# Altium footprint library altium_parts_templates_PCB.PcbLib: 93 footprints (part 5 of 6)
Each footprint in its own frame and in the unit in brackets; x right, y up, seen from the top. Pads: shape width x height; smd on the part's side, far side on the other; paste and mask are expansions set on the pad; w line width, h text height; cw(c..) or ccw(c..) is an arc to the next point about the centre after c.
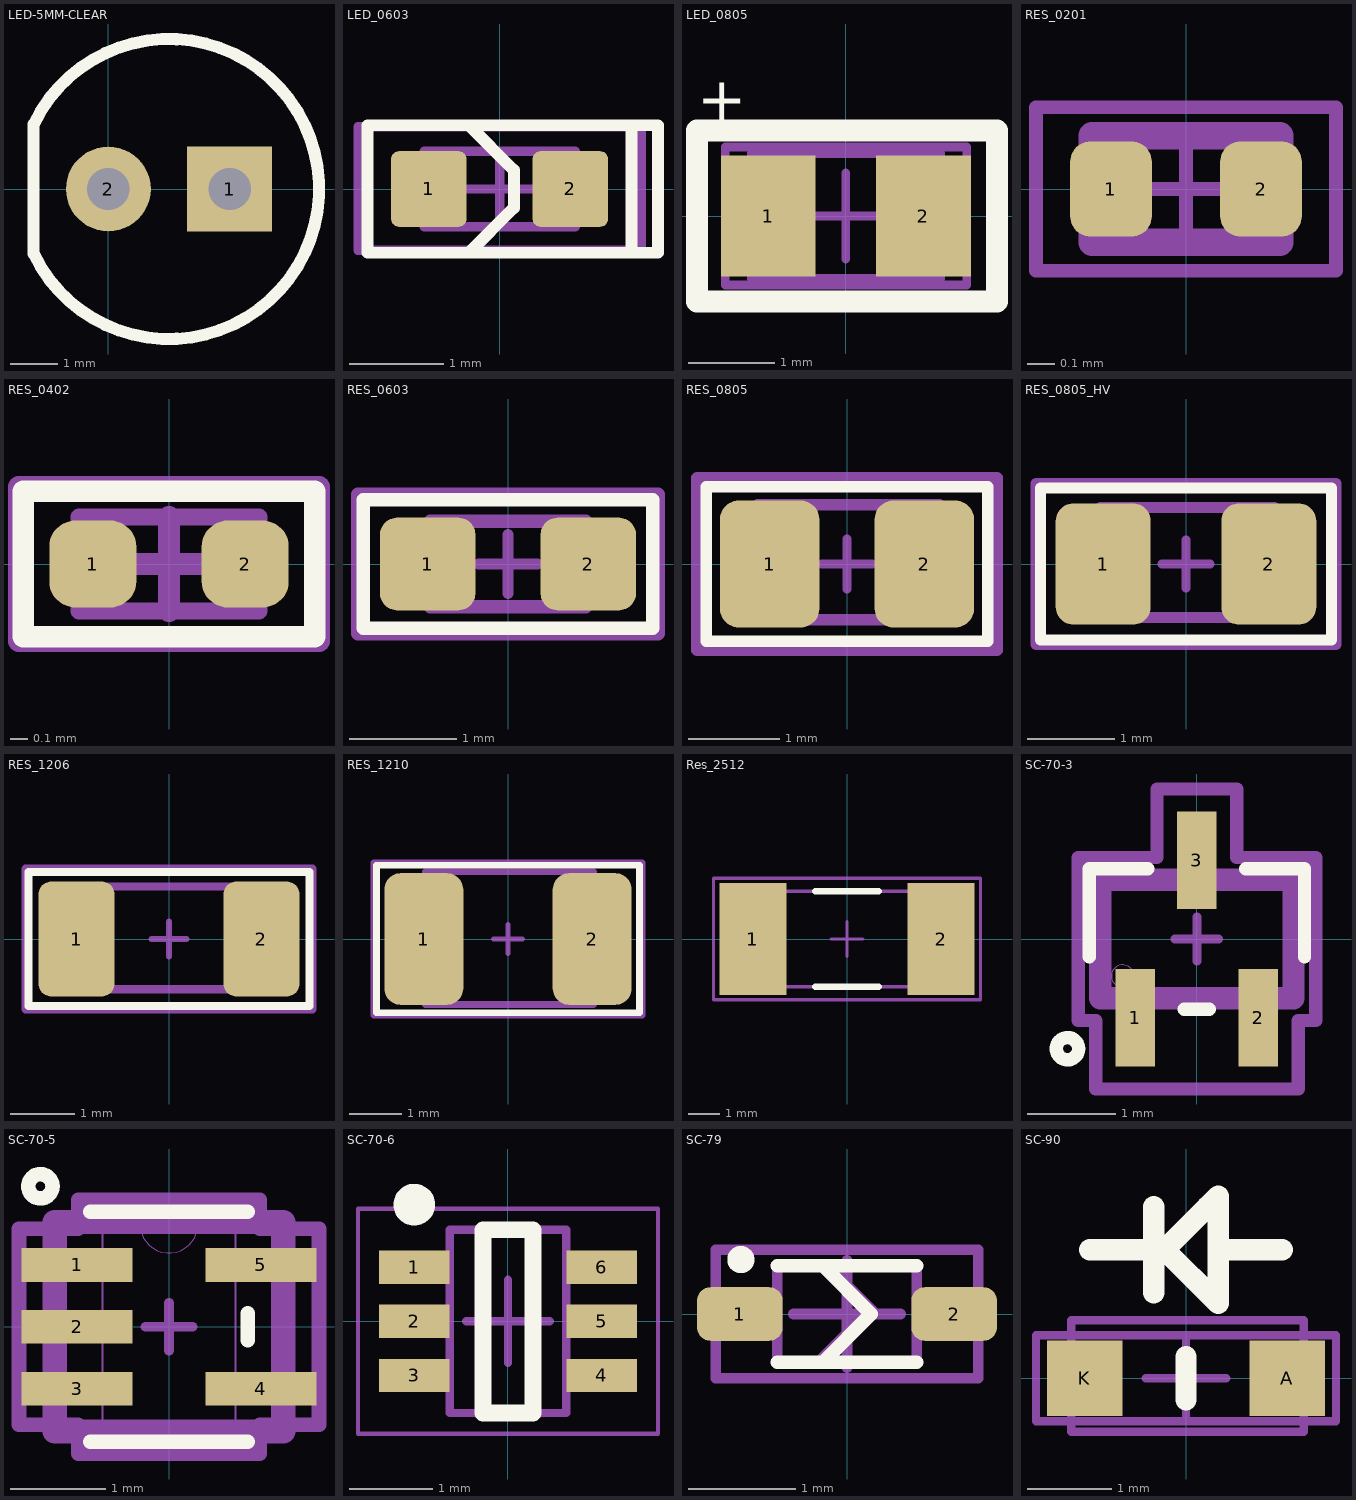
[diagram p4: the footprints below, top view; thin cyan lines are the x and y axes]

## LED-5MM-CLEAR [mil] "LED 5MM - Through Hole"
height 200
pads (2):
  rect 70x70 hole 35: 1(100,0)
  round 70 hole 35: 2(0,0)
Top Overlay:
  lines w10: -61.59,-53.37 ccw(c50,0) -61.59,53.37 -61.59,-53.37
3D body "SW3dPS-LEDd5C.STEP": height 344.75, standoff -237.93, extent -45.69,-119 167.69,117.99

## LED_0603 [mm] "LED_0603"
height 1.45
pads (2):
  rrect20% 0.8x0.8 smd paste-0.025 mask+0.05: 1(-0.749,0) 2(0.749,0)
Top Overlay:
  lines w0.127: -0.325,-0.675 0.15,-0.2 0.15,0.2 -0.325,0.675 ; 1.397,-0.675 1.397,0.675 1.676,0.675 1.676,-0.675 -1.4,-0.675 -1.4,0.675 1.626,0.675
Top Assembly Drawing:
  lines w0.1: -0.8,-0.4 -0.8,0.4 0.8,0.4 0.8,-0.4 -0.8,-0.4
Top Courtyard:
  lines w0.1: -0.4,0 0.4,0 ; 0,-0.4 0,0.4 ; -1.5,-0.65 -1.5,0.66 1.5,0.66 1.5,-0.65 -1.5,-0.65
3D body "LED-0603H0.75.stp": height 0.75, standoff 0, extent -0.85,-0.45 0.85,0.45

## LED_0805 [mm] "LED_0805"
height 1.4
pads (2):
  rect 1.1x1.4 smd: 1(-0.9,0) 2(0.9,0)
Top Overlay:
  lines w0.254: -1.727,-0.991 1.753,-0.991 1.753,0.864 1.753,0.991 -1.727,0.991 -1.727,-0.991
  text "+" at -1.727,1.118 h0.5
Top 3D Model:
  lines w0.1: -1.1,-0.725 -1.1,0.725 1.1,0.725 1.1,-0.725 -1.1,-0.725
Top Courtyard:
  lines w0.1: -0.5,0 0.5,0 ; 0,-0.5 0,0.5 ; -1.4,-0.8 -1.4,0.8 1.4,0.8 1.4,-0.8 -1.4,-0.8
3D body: height 0.2, standoff 0, extent -1.1,-0.725 1.1,0.725
3D body: height 1.5, standoff 0.2, extent -0.6,-0.725 0.6,0.725

## RES_0201 [mm] "Resistor 0201"
height 0.25
pads (2):
  rrect50% 0.3x0.35 smd paste+0 mask+0.02: 1(-0.275,0) 2(0.275,0)
Top Assembly Drawing:
  lines w0.1: -0.345,-0.195 0.345,-0.195 0.345,0.195 -0.345,0.195 -0.345,-0.195
Top Courtyard:
  lines w0.05: -0.195,0 0.195,0 ; 0,-0.195 0,0.195 ; -0.55,-0.3 -0.55,0.3 0.55,0.3 0.55,-0.3 -0.55,-0.3
3D body "RES0201.stp": height 0.28, standoff -0.02, extent -0.3,-0.15 0.3,0.15

## RES_0402 [mil] "Resistor - 0402"
height 13.78
pads (2):
  rrect60% 20x20 smd paste+0 mask+1.97: 1(-17.5,0) 2(17.5,0)
Top Overlay:
  lines w5: -33.46,-16.73 -33.46,16.73 33.46,16.73 33.46,-16.73 -33.46,-16.73
Top Assembly Drawing:
  lines w3.94: -20.67,-10.83 -20.67,10.83 20.67,10.83 20.67,-10.83 -20.67,-10.83
Top Courtyard:
  lines w5: -10.83,0 10.83,0 ; 0,-10.83 0,10.83 ; -34.45,-17.72 34.45,-17.72 34.45,17.72 -34.45,17.72 -34.45,-17.72
3D body "RES0402.stp": height 11.02, standoff -0.79, extent -19.68,-9.84 19.7,9.85

## RES_0603 [mil] "Resistor - 0603"
height 17.72
pads (2):
  rrect35% 35x34 smd paste+0 mask+1.97: 1(-29.5,0) 2(29.5,0)
Top Overlay:
  lines w5: -53.15,-23.62 53.15,-23.62 53.15,23.62 -53.15,23.62 -53.15,-23.62
Top Assembly Drawing:
  lines w5: -28.54,-15.75 28.54,-15.75 28.54,15.75 -28.54,15.75 -28.54,-15.75
Top Courtyard:
  lines w3.94: -10.83,0 10.83,0 ; 0,-10.83 0,10.83
  lines w5: -55.12,-25.59 55.12,-25.59 55.12,25.59 -55.12,25.59 -55.12,-25.59
3D body "RES0603.stp": height 16.93, standoff -0.79, extent -31.49,-15.74 31.51,15.76

## RES_0805 [mil] "Resistor - 0805"
height 19.68
pads (2):
  rrect37% 43x55 smd paste+0 mask+1.97: 1(-33.5,0) 2(33.5,0)
Top Overlay:
  lines w5: -61.02,-33.46 61.02,-33.46 61.02,33.46 -61.02,33.46 -61.02,-33.46
Top Assembly Drawing:
  lines w5: -38.74,-24.21 -38.74,25.59 40,25.59 40,-24.21 -38.74,-24.21
Top Courtyard:
  lines w3.94: -10.83,0 10.83,0 ; 0,-10.83 0,10.83
  lines w5: -64.96,-37.4 64.96,-37.4 64.96,37.4 -64.96,37.4 -64.96,-37.4
3D body "RES0805.stp": height 18.9, standoff -0.79, extent -39.36,-24.8 39.38,24.42

## RES_0805_HV [mil] "Resistor - 0805 - HV"
height 19.68
pads (2):
  rrect37% 43x55 smd paste+0 mask+1.97: 1(-37.5,0) 2(37.5,0)
Top Overlay:
  lines w5: -65.94,-34.45 65.94,-34.45 65.94,34.45 -65.94,34.45 -65.94,-34.45
Top Assembly Drawing:
  lines w5: -38.74,-24.21 -38.74,25.59 40,25.59 40,-24.21 -38.74,-24.21
Top Courtyard:
  lines w3.94: -10.83,0 10.83,0 ; 0,-10.83 0,10.83
  lines w5: -67.91,-36.42 67.91,-36.42 67.91,36.42 -67.91,36.42 -67.91,-36.42
3D body "RES0805.stp": height 18.9, standoff -0.79, extent -39.36,-24.8 39.38,24.42

## RES_1206 [mil] "Resistor - 1206"
height 21.65
pads (2):
  rrect34% 47x71 smd paste+0 mask+1.97: 1(-57,0) 2(57,0)
Top Overlay:
  lines w5: -86.61,-41.34 -86.61,41.34 86.61,41.34 86.61,-41.34 -86.61,-41.34
Top Assembly Drawing:
  lines w5: -62.99,-30.99 63.98,-30.99 63.98,32.48 -62.99,32.48 -62.99,-30.99
Top Courtyard:
  lines w3.94: -10.83,0 10.83,0 ; 0,-10.83 0,10.83
  lines w5: -88.58,-43.31 -88.58,43.31 88.58,43.31 88.58,-43.31 -88.58,-43.31
3D body "RES1206.stp": height 20.87, standoff -0.79, extent -61.02,-30.39 61.03,30.71

## RES_1210 [mm] "Resistor - 1210"
height 0.55
pads (2):
  rrect40% 1.5x2.5 smd paste+0 mask+0.05: 1(-1.6,0) 2(1.6,0)
Top Overlay:
  lines w0.127: -2.5,-1.4 -2.5,1.4 2.5,1.4 2.5,-1.4 -2.5,-1.4
Top Assembly Drawing:
  lines w0.127: -1.575,-1.245 1.625,-1.245 1.625,1.275 -1.575,1.275 -1.575,-1.245
Top Courtyard:
  lines w0.1: -0.275,0 0.275,0 ; 0,-0.275 0,0.275
  lines w0.127: -2.55,-1.45 2.55,-1.45 2.55,1.45 -2.55,1.45 -2.55,-1.45
3D body "User Library-RESC3225X06N.STEP": height 0.53, standoff -0.02, extent -1.625,-1.25 1.575,1.25

## Res_2512 [mil]
pads (2):
  rect 82.5x138 smd paste-11.81: 1(-116.25,0) 2(116.25,0)
Top Overlay:
  lines w7.87: -39.37,-59.06 39.37,-59.06 ; -39.37,59.06 39.37,59.06
Top 3D Model:
  lines w3.94: -125,-59 -125,59 126,59 126,-59 -125,-59
Top Courtyard:
  lines w3.94: -19.69,0 19.68,0 ; 0,-21.65 0,21.65 ; -165,-75 -165,75 165,75 165,-75 -165,-75
3D body "R_2512.step": height 63.07, standoff 0, extent -124.99,-59.05 125,59.06

## SC-70-3 [mm] "SOT-323, SC-70-3"
pads (3):
  rect 0.451x1.111 smd paste+0 mask+0: 1(-0.7,-0.9) 2(0.7,-0.9) 3(0,0.9)
Top Overlay:
  circle w0.152: c-1.475,-1.25 r0.127
  lines w0.152: -1.227,-0.204 -1.227,0.802 -0.558,0.802 ; -0.142,-0.802 0.142,-0.802 ; 0.558,0.802 1.227,0.802 1.227,-0.204
Top Assembly Drawing:
  lines w0.254: -1.1,-0.675 1.1,-0.675 1.1,0.675 -1.1,0.675 -1.1,-0.675
Top 3D Model:
  circle w0: c-0.846,-0.421 r0.127
  lines w0.025: -1.1,-0.675 -1.1,0.675 1.1,0.675 1.1,-0.675 -1.1,-0.675 ; -0.9,-1.1 -0.5,-1.1 -0.5,-0.675 -0.9,-0.675 -0.9,-1.1 ; -0.2,0.675 -0.2,1.1 0.2,1.1 0.2,0.675 -0.2,0.675 ; 0.5,-1.1 0.9,-1.1 0.9,-0.675 0.5,-0.675 0.5,-1.1
Top Courtyard:
  lines w0.1: -0.25,0 0.25,0 ; 0,-0.25 0,0.25
  lines w0.152: -1.354,-0.929 -1.154,-0.929 -1.154,-1.71 1.154,-1.71 1.154,-0.929 1.354,-0.929 1.354,0.929 0.454,0.929 0.454,1.71 -0.454,1.71 -0.454,0.929 -1.354,0.929 -1.354,-0.929

## SC-70-5 [mil] "SOT-353, 5-TSSOP, SC-70-5"
pads (5):
  rect 46x14 smd paste+0 mask+0: 1(-38,25.59) 2(-38,0) 3(-38,-25.59) 4(38,-25.59) 5(38,25.59)
Top Overlay:
  circle w6: c-53.15,58.07 r5
  lines w6: -32.5,-47.5 32.5,-47.5 ; -32.5,47.5 32.5,47.5 ; 32.5,-5.49 32.5,5.49
Top Assembly Drawing:
  lines w10: -47.24,-43.31 47.24,-43.31 47.24,43.31 -47.24,43.31 -47.24,-43.31
Top 3D Model:
  lines w0: -12,42.5 ccw(c0,42.5) 12,42.5
  lines w1: -47,-31.59 -47,-19.59 -27.5,-19.59 -27.5,-31.59 -47,-31.59 ; -47,-6 -47,6 -27.5,6 -27.5,-6 -47,-6 ; -47,19.59 -47,31.59 -27.5,31.59 -27.5,19.59 -47,19.59 ; -27.5,-42.5 27.5,-42.5 27.5,42.5 -27.5,42.5 -27.5,-42.5 ; 27.5,-31.59 27.5,-19.59 47,-19.59 47,-31.59 27.5,-31.59 ; 27.5,19.59 27.5,31.59 47,31.59 47,19.59 27.5,19.59
Top Courtyard:
  lines w3.94: -9.84,0 9.84,0 ; 0,-9.84 0,9.84
  lines w6: -62,-40.59 -37.5,-40.59 -37.5,-52.5 37.5,-52.5 37.5,-40.59 62,-40.59 62,40.59 37.5,40.59 37.5,52.5 -37.5,52.5 -37.5,40.59 -62,40.59 -62,-40.59
3D body: height 10, standoff 0, extent 0,0 0,0
3D body: height 10, standoff 0, extent 0,0 0,0
3D body "DCK5.stp": height 43.11, standoff 0, extent -47,-42.51 47.01,42.52

## SC-70-6 [mm] "6-TSSOP, SC-88, SOT-363, SC-70-6"
height 1.1
pads (6):
  rect 0.85x0.4 smd: 1(-1.125,0.65) 2(-1.125,0) 3(-1.125,-0.65) 4(1.125,-0.65) 5(1.125,0) 6(1.125,0.65)
Top Overlay:
  circle w0.25: c-1.125,1.4 r0.125
  lines w0.2: -0.3,-1.1 -0.3,1.1 0.3,1.1 0.3,-1.1 -0.3,-1.1
Top 3D Model:
  lines w0.1: -0.7,-1.1 -0.7,1.1 0.7,1.1 0.7,-1.1 -0.7,-1.1
Top Courtyard:
  lines w0.05: -1.8,-1.35 -1.8,1.35 1.8,1.35 1.8,-1.35 -1.8,-1.35
  lines w0.1: -0.5,0 0.5,0 ; 0,-0.5 0,0.5
3D body "SOT363.step": height 1.1, standoff 0, extent -1.2,-1.1 1.2,1.1

## SC-79 [mm] "SC-79, SOD-523F"
height 0.7
pads (2):
  rrect50% 0.8x0.5 smd paste+0 mask+0.05: 1(-1,0) 2(1,0)
Top Overlay:
  circle w0.152: c-0.991,0.508 r0.051
  lines w0.127: -0.65,-0.45 0.65,-0.45 ; -0.65,0.45 0.65,0.45 ; -0.225,-0.45 0.225,0 -0.225,0.45
Top Assembly Drawing:
  lines w0.1: -0.65,-0.45 -0.65,0.45 0.65,0.45 0.65,-0.45 -0.65,-0.45
  lines w0.127: -0.23,-0.43 0.225,0.025 -0.18,0.43
Top Courtyard:
  lines w0.1: -0.5,0 0.5,0 ; 0,-0.5 0,0.5 ; -1.225,-0.6 -1.225,0.6 1.225,0.6 1.225,-0.6 -1.225,-0.6
3D body "DIO_SOD-523F.step": height 0.7, standoff 0, extent -0.8,-0.45 0.8,0.45

## SC-90 [mm] "SC-90, SOD-323F"
pads (2):
  rect 0.9x0.9 smd: A(1.2,0) K(-1.2,0)
Top Overlay:
  lines w0.254: -1.143,1.524 -0.381,1.524 ; -0.381,1.016 -0.381,2.032 ; 0,-0.254 0,0.254 ; 0.381,1.524 1.143,1.524 ; -0.254,1.524 0.381,0.889 0.381,1.143 0.381,1.905 0.381,2.159 0.254,2.032 -0.254,1.524
Top 3D Model:
  lines w0.1: -1.359,-0.635 -1.359,0.686 1.397,0.686 1.397,-0.635 -1.359,-0.635
Top Courtyard:
  lines w0.1: -0.475,0 0.475,0 ; 0,-0.508 0,0.508 ; -1.778,-0.508 1.778,-0.508 1.778,0.508 -1.778,0.508 -1.778,-0.508
3D body "SOD-323F.stp": height 0.82, standoff 0, extent -1.359,-0.686 1.359,0.686